# Altium footprint library AD_Comments.PcbLib: 178 footprints (part 3 of 12)
Each footprint in its own frame and in the unit in brackets; x right, y up, seen from the top. Pads: shape width x height; smd on the part's side, far side on the other; paste and mask are expansions set on the pad; w line width, h text height; cw(c..) or ccw(c..) is an arc to the next point about the centre after c.
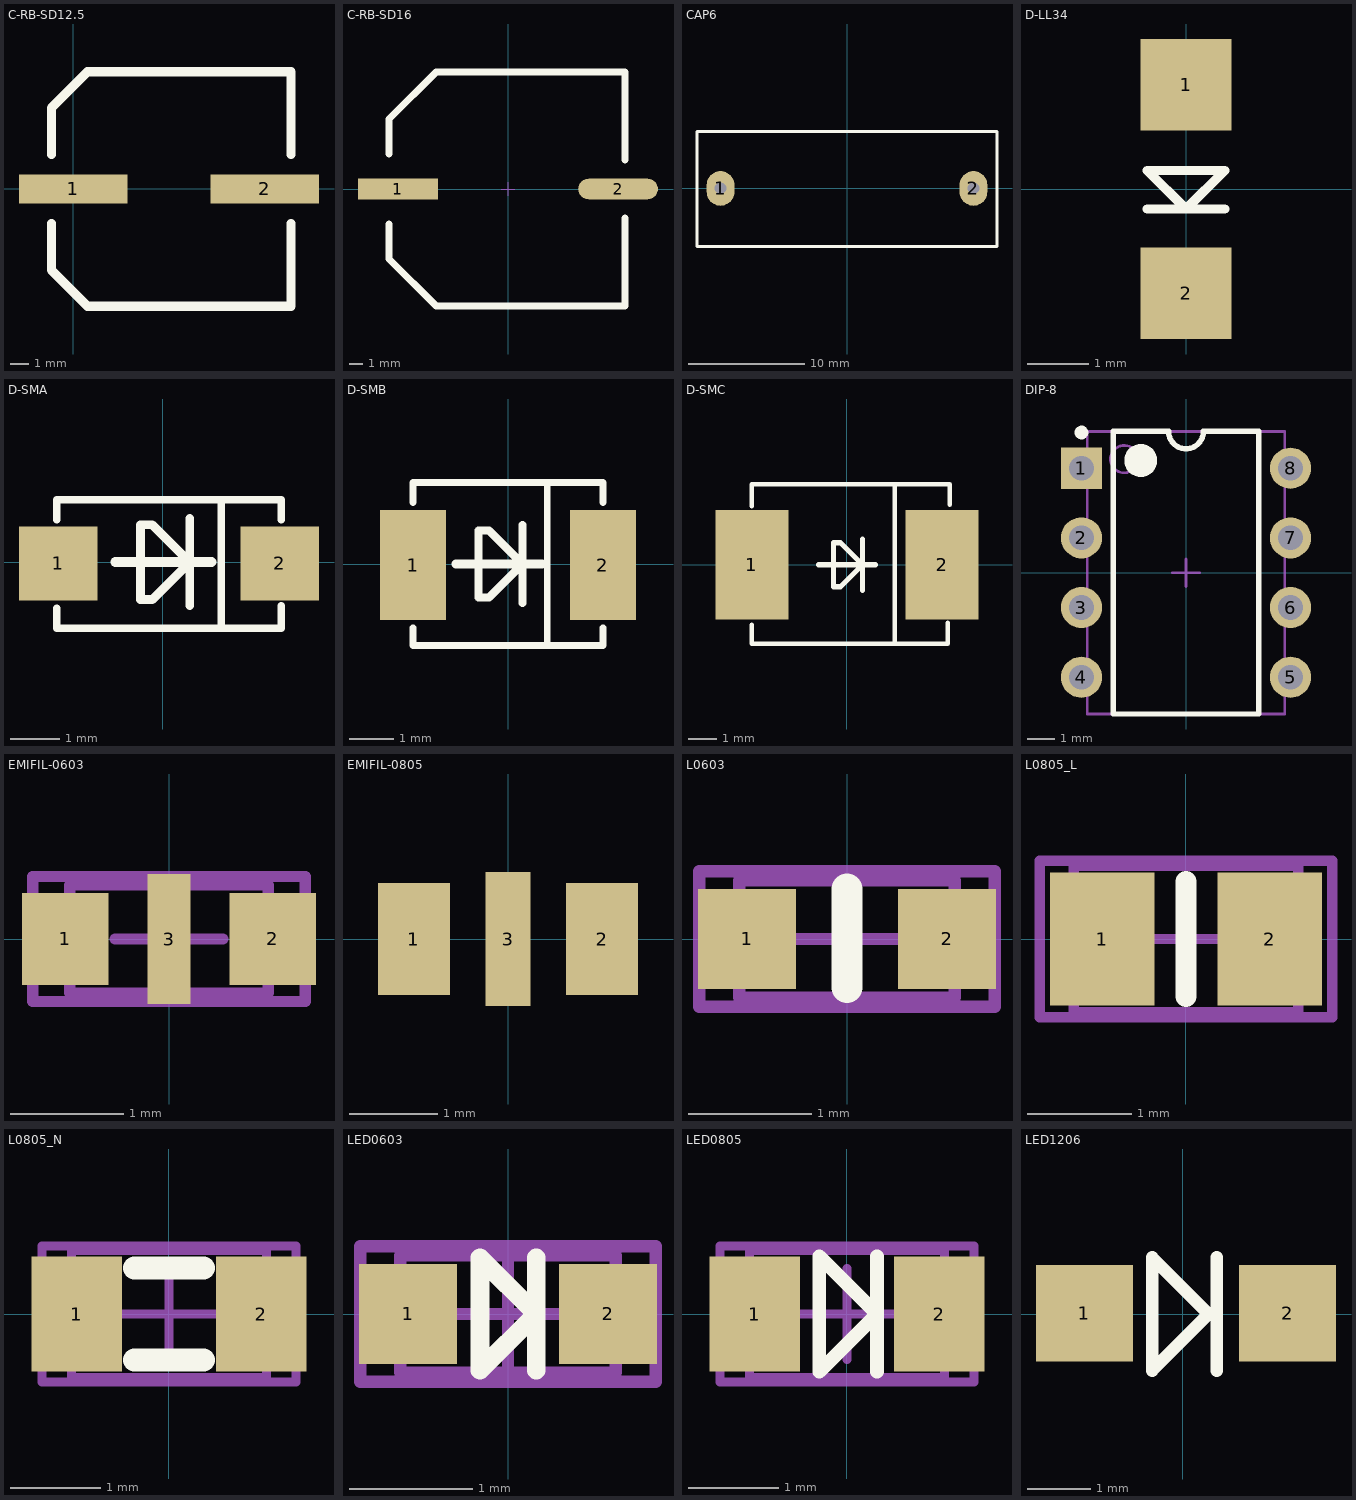
[diagram p2: the footprints below, top view; thin cyan lines are the x and y axes]

## C-RB-SD12.5 [mm]
pads (2):
  rect 6x1.6 smd: 1(0,0) 2(10.625,0)
Top Overlay:
  lines w0.508: -1.202,-1.905 -1.202,-4.498 0.799,-6.499 12.065,-6.499 12.065,-1.905 ; -1.202,1.905 -1.202,4.494 0.797,6.493 0.799,6.495 12.065,6.495 12.065,1.905

## C-RB-SD16 [mm]
pads (2):
  rect 5.8x1.5 smd: 1(-8.001,0)
  oval 5.8x1.5 smd: 2(8.001,0)
Top Overlay:
  lines w0.508: -8.636,-2.54 -8.636,-5.08 -5.216,-8.5 8.5,-8.5 8.5,-4.25 8.5,-2.125 ; -8.636,2.54 -8.636,5.08 -5.216,8.5 8.5,8.5 8.5,4.25 8.5,2.125
Mechanical 15:
  lines w0.076: -0.508,0 0.508,0 ; 0,-0.508 0,0.508
3D body "CM H(16X16.5).STEP": height 16.5, standoff -0.01, extent -9.4,-8.5 9.4,8.5

## CAP6 [mm]
pads (2):
  oval 2.4x3 hole 1: 1(-10.922,0) 2(10.922,0)
Top Overlay:
  lines w0.254: -12.954,-5.029 -12.954,4.928 12.954,4.928 12.954,-5.029 -12.954,-5.029
3D body "C10x26.STEP": height 19, standoff -2, extent -12.954,-5 13.046,5

## D-LL34 [mm]
pads (2):
  rect 1.5x1.5 smd: 1(0,1.714) 2(0,-1.714)
Top Overlay:
  lines w0.152: -0.635,-0.33 0.635,-0.33 ; -0.635,0.305 0,-0.33 0.635,0.305 -0.635,0.305
3D body "User Library-smd diode 1206.STEP": height 1.43, standoff -0.02, extent -0.725,-1.75 0.725,1.75

## D-SMA [mm]
height 2
pads (2):
  rect 1.6x1.5 smd: 1(-2.123,-0.025) 2(2.377,-0.025)
Top Overlay:
  lines w0.152: -2.159,-0.94 -2.159,-1.346 2.413,-1.346 2.413,-0.889 ; -2.159,0.864 -2.159,1.27 2.413,1.27 2.413,0.864 ; 1.194,-1.346 1.194,1.27
  lines w0.178: 0.548,-0.889 0.548,0.889 ; -0.452,-0.762 -0.214,-0.762 0.548,0 -0.214,0.762 -0.452,0.762 -0.452,-0.762
  lines w0.2: -0.965,0 0.991,0
3D body "SW3dPS-DO-214AC SMA.STEP": height 2.42, standoff 0.02, extent -2.54,-1.33 2.66,1.27

## D-SMB [mm] "DO-214-AA/SMB;"
height 2.54
pads (2):
  rect 1.5x2.5 smd: 1(-2.159,-0.025) 2(2.159,-0.025)
Top Overlay:
  lines w0.152: -2.159,-1.448 -2.159,-1.854 2.159,-1.854 2.159,-1.448 ; -2.159,1.397 -2.159,1.854 2.159,1.854 2.159,1.397 ; 0.889,-1.854 0.889,1.854
  lines w0.178: 0.33,-0.889 0.33,0.889 ; -0.67,-0.762 -0.67,0.762 -0.432,0.762 0.33,0 -0.432,-0.762 -0.67,-0.762
  lines w0.2: -1.183,0 0.773,0
3D body "User Library-DO-214AA_SMB.STEP": height 2.2, standoff -0.05, extent -2.637,-1.85 2.663,1.85

## D-SMC [mm] "贴片二极管"
height 1.5
pads (2):
  rect 2.54x3.81 smd: 1(-3.287,0) 2(3.313,0)
Top Overlay:
  lines w0.152: -3.289,-2.083 -3.289,-2.743 3.505,-2.743 3.505,-2.007 ; -3.289,2.032 -3.289,2.794 3.581,2.794 3.581,2.083 ; 1.664,-2.743 1.664,2.769
  lines w0.178: 0.548,-0.889 0.548,0.889 ; -0.452,-0.762 -0.452,0.762 -0.214,0.762 0.548,0 -0.214,-0.762 -0.452,-0.762
  lines w0.2: -0.965,0 0.991,0
3D body "DO-214AB.STEP": height 2.7, standoff 0, extent -4.06,-3.1 4.06,3.1

## DIP-8 [mm] "DIP; 8 Leads; Row Spacing 7.62 mm; Pitch 2.54 mm"
height 5.08
pads (8):
  rect 1.5x1.5 hole 0.9: 1(-3.81,3.81)
  round 1.5 hole 0.9: 2(-3.81,1.27) 3(-3.81,-1.27) 4(-3.81,-3.81) 5(3.81,-3.81) 6(3.81,-1.27) 7(3.81,1.27) 8(3.81,3.81)
Top Overlay:
  circle w0.25: c-3.81,5.11 r0.125
  circle w0.6: c-1.65,4.09 r0.3
  lines w0.2: -2.65,-5.15 -2.65,5.15 -0.635,5.15 ccw(c0,5.15) 0.635,5.15 2.65,5.15 2.65,-5.15 -2.65,-5.15
Mechanical 13:
  circle w0.1: c-2.25,4.14 r0.5
  lines w0.1: -3.6,-5.15 -3.6,5.15 3.6,5.15 3.6,-5.15 -3.6,-5.15
Mechanical 15:
  lines w0.1: -0.5,0 0.5,0 ; 0,-0.5 0,0.5
3D body "DIP.STEP": height 5.33, standoff -2.41, extent -3.937,-5.08 3.937,5.08

## EMIFIL-0603 [mil] "穿芯电容 SMD 0603 (1608)  低密度"
height 36
pads (3):
  rect 30x32 smd: 1(-36,0) 2(36,0)
  rect 15x45 smd: 3(0,0)
Mechanical 13:
  lines w3.94: -34.45,-18.7 34.45,-18.7 34.45,18.7 -34.45,18.7 -34.45,-18.7
Mechanical 15:
  lines w3.94: -18.7,0 18.7,0 ; 0,-18.7 0,18.7 ; -47.24,-21.65 47.24,-21.65 47.24,21.65 -47.24,21.65 -47.24,-21.65
3D body "User Library-EMIFIL_0603.step": height 23.77, standoff 0, extent -31.49,-16.11 31.5,16.12

## EMIFIL-0805 [mil] "穿芯电容0805-低密度"
height 27.56
pads (3):
  rect 32x50 smd: 1(-42,0) 2(42,0)
  rect 20x60 smd: 3(0,0)
3D body "User Library-X2Y_0805_(X15).STEP": height 40.04, standoff -0.04, extent -40,-25.04 40,25.04

## L0603 [mil] "Chip Inductor, Body 1.6x0.8mm, IPC High Density"
height 36
pads (2):
  rect 31.5x32 smd: 1(-32,0) 2(32,0)
Top Overlay:
  lines w10: 0,-15.5 0,16
Mechanical 13:
  lines w3.94: -34.45,-18.7 -34.45,18.7 34.45,18.7 34.45,-18.7 -34.45,-18.7
Mechanical 15:
  lines w3.94: -18.7,0 18.7,0 ; 0,-18.7 0,18.7 ; -47.24,-21.65 -47.24,21.65 47.24,21.65 47.24,-21.65 -47.24,-21.65
3D body "User Library-Chip Inductor0603.step": height 37.4, standoff 0, extent -31.49,-15.74 31.5,15.75

## L0805_L [mm] "Chip Inductor, Body 2.0x1.2mm, IPC High Density"
height 0.7
pads (2):
  rect 1x1.27 smd: 1(-0.8,0) 2(0.8,0)
Top Overlay:
  lines w0.2: 0,-0.55 0,0.55
Mechanical 13:
  lines w0.1: -1.075,-0.7 -1.075,0.7 1.075,0.7 1.075,-0.7 -1.075,-0.7
Mechanical 15:
  lines w0.1: -0.5,0 0.5,0 ; 0,-0.5 0,0.5 ; -1.4,-0.75 -1.4,0.75 1.4,0.75 1.4,-0.75 -1.4,-0.75
3D body "User Library-Chip Inductor0805.step": height 1, standoff 0.05, extent -1,-0.6 1,0.6

## L0805_N [mm] "Chip Inductor, Body 2.0x1.2mm, IPC Medium Density"
height 0.7
pads (2):
  rect 1x1.27 smd: 1(-1.016,0) 2(1.016,0)
Top Overlay:
  lines w0.254: -0.381,-0.508 0.381,-0.508 ; -0.381,0.508 0.381,0.508
Mechanical 13:
  lines w0.1: -1.075,-0.7 -1.075,0.7 1.075,0.7 1.075,-0.7 -1.075,-0.7
Mechanical 15:
  lines w0.1: -0.5,0 0.5,0 ; 0,-0.5 0,0.5 ; -1.4,-0.75 -1.4,0.75 1.4,0.75 1.4,-0.75 -1.4,-0.75
3D body "User Library-Chip Inductor0805.step": height 1, standoff 0.05, extent -1,-0.6 1,0.6

## LED0603 [mil] "Chip LED, Body 1.6x0.8mm, IPC High Density"
height 36
pads (2):
  rect 31.5x32 smd: 1(-32,0) 2(32,0)
Top Overlay:
  lines w6: 9,-18 9,18 ; -9,-18 -9,18 9,0 -9,-18
Mechanical 13:
  lines w3.94: -34.45,-18.7 -34.45,18.7 34.45,18.7 34.45,-18.7 -34.45,-18.7
Mechanical 15:
  lines w3.94: -18.7,0 18.7,0 ; 0,-18.7 0,18.7 ; -47.24,-21.65 -47.24,21.65 47.24,21.65 47.24,-21.65 -47.24,-21.65
3D body "User Library-LED SMD0805.STEP": height 33.45, standoff 0.23, extent -40.6,-17.7 40.6,17.98

## LED0805 [mm] "Chip LED, Body 2.0x1.2mm, IPC Medium Density"
height 0.7
pads (2):
  rect 1x1.27 smd: 1(-1.016,0) 2(1.016,0)
Top Overlay:
  lines w0.152: 0.33,-0.635 0.33,0.635 ; -0.305,-0.635 0.33,0 -0.305,0.635 -0.305,-0.635
Mechanical 13:
  lines w0.1: -1.075,-0.7 1.075,-0.7 1.075,0.7 -1.075,0.7 -1.075,-0.7
Mechanical 15:
  lines w0.1: -0.5,0 0.5,0 ; 0,-0.5 0,0.5 ; -1.4,-0.75 1.4,-0.75 1.4,0.75 -1.4,0.75 -1.4,-0.75
3D body "User Library-CHIPLED-0805.step": height 0.9, standoff -0.01, extent -1.05,-0.675 1.05,0.675

## LED1206 [mil] "贴片元件"
height 59.06
pads (2):
  rect 60x60 smd: 1(-61.02,0.49) 2(64.96,0.49)
Top Overlay:
  lines w7.87: 21,-35 21,35 ; -19,-35 16,0 -19,35 -19,-35
3D body "User Library-FYLS-1206.step": height 43.31, standoff 0, extent -61.02,-31 64.96,31.99